# Altium footprint library Connector.PcbLib: 230 footprints (part 14 of 15)
Each footprint in its own frame and in the unit in brackets; x right, y up, seen from the top. Pads: shape width x height; smd on the part's side, far side on the other; paste and mask are expansions set on the pad; w line width, h text height; cw(c..) or ccw(c..) is an arc to the next point about the centre after c.
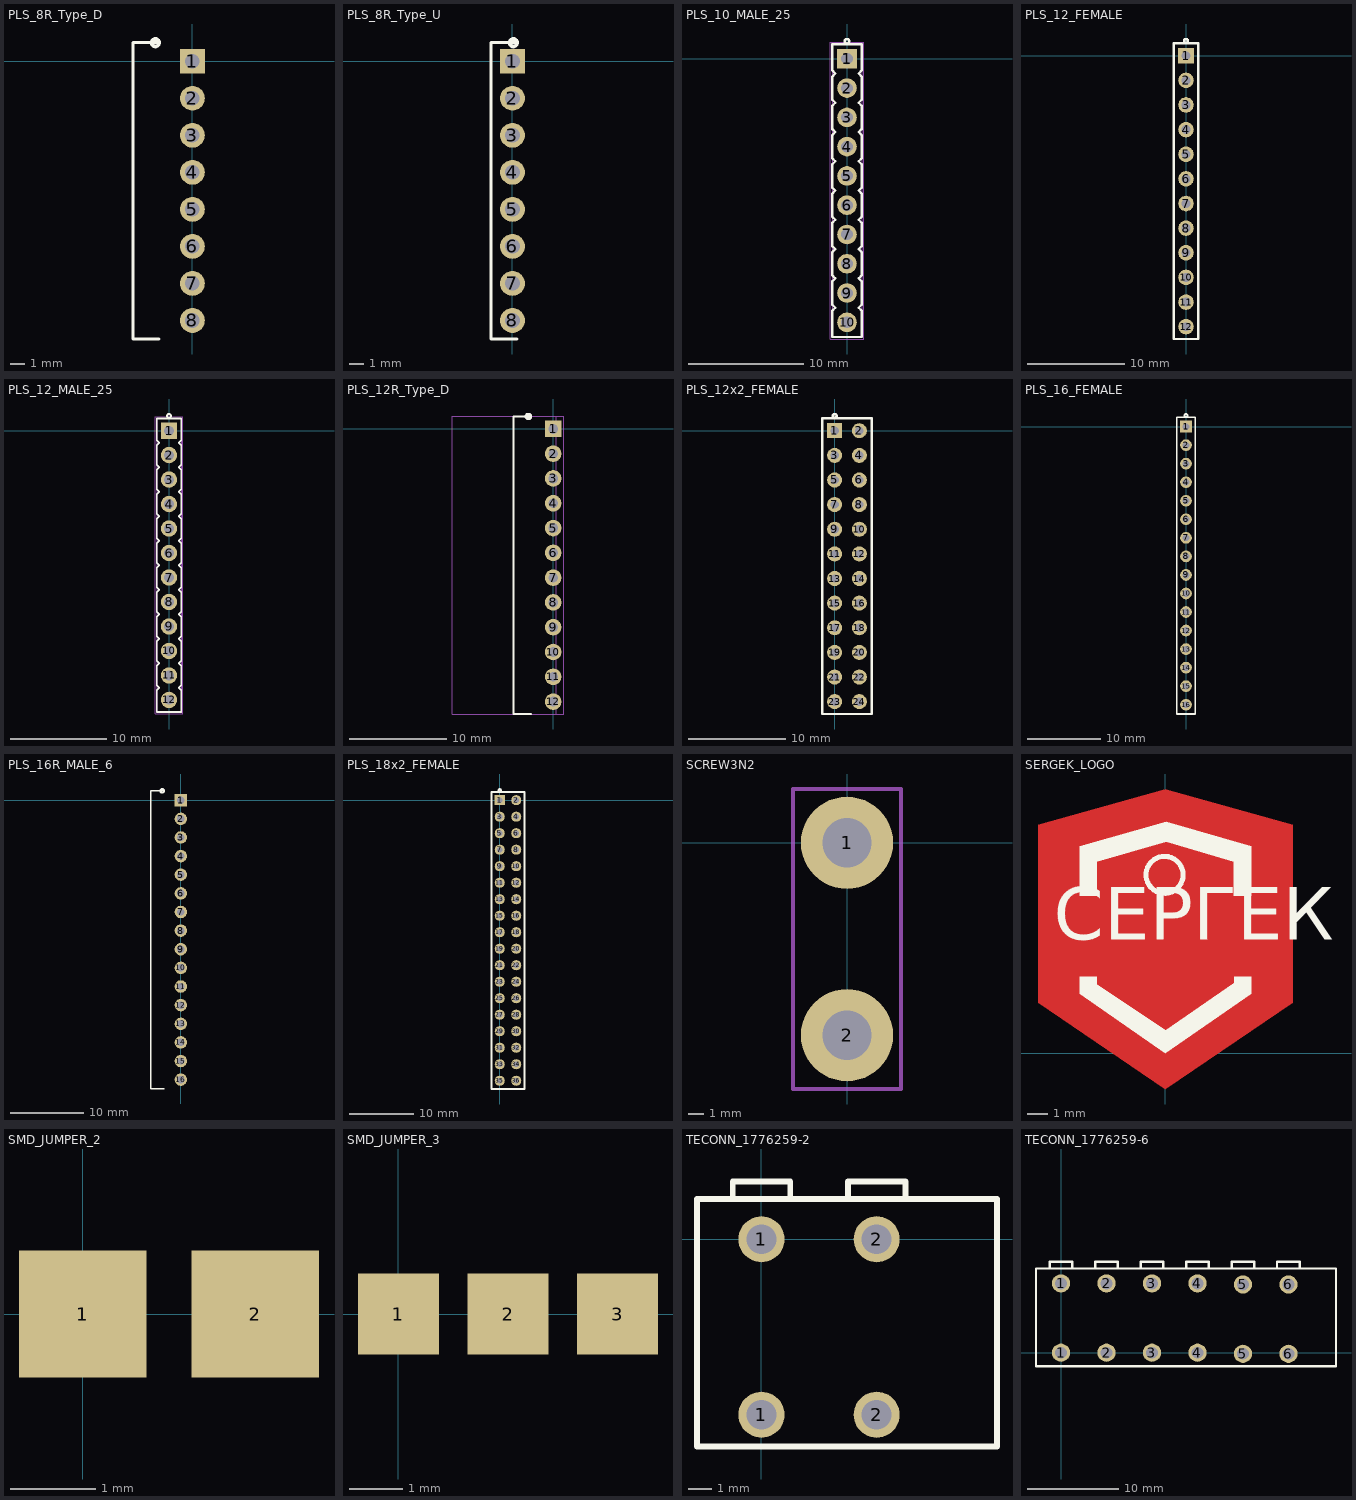
[diagram p13: the footprints below, top view; thin cyan lines are the x and y axes]

## PLS_8R_Type_D [mm] "CONN HEADER R/A 8POS 2.54MM"
height 11.2
pads (8):
  rect 1.7x1.7 hole 1: 1(0,0)
  round 1.7 hole 1: 2(0,-2.54) 3(0,-5.08) 4(0,-7.62) 5(0,-10.16) 6(0,-12.7) 7(0,-15.24) 8(0,-17.78)
Top Overlay:
  circle w0.254: c-2.54,1.27 r0.254
  lines w0.2: -4.064,-19.05 -4.064,-16.51 -4.064,-13.97 -4.064,-11.43 -4.064,-8.89 -4.064,-6.35 -4.064,-3.81 -4.064,-1.27 -4.064,1.27 -2.286,1.27 ; -4.064,-19.041 -2.286,-19.041
3D body: height 11, standoff 0, extent 5.08,0 5.08,0
3D body "User Library-PLS-8R-1.STEP": height 2.52, standoff -3.23, extent -10.34,-19.045 0.32,1.275

## PLS_8R_Type_U [mm] "CONN HEADER R/A 8POS 2.54MM"
height 11.2
pads (8):
  rect 1.7x1.7 hole 1: 1(0,0)
  round 1.7 hole 1: 2(0,-2.54) 3(0,-5.08) 4(0,-7.62) 5(0,-10.16) 6(0,-12.7) 7(0,-15.24) 8(0,-17.78)
Top Overlay:
  circle w0.254: c0.06,1.27 r0.254
  lines w0.2: -1.464,-19.05 -1.464,-16.51 -1.464,-13.97 -1.464,-11.43 -1.464,-8.89 -1.464,-6.35 -1.464,-3.81 -1.464,-1.27 -1.464,1.27 0.314,1.27 ; -1.464,-19.041 0.314,-19.041
3D body: height 11, standoff 0, extent 5.08,0 5.08,0
3D body "User Library-PLS-8R gold.STEP": height 5.45, standoff -3, extent -7.35,-19.05 1.27,1.27

## PLS_10_MALE_25 [mm] "PLH-20 (ZL2029-20),(KLS1-218-1-10-S-3,3*6,5*29)"
height 25
pads (10):
  rect 1.7x1.7 hole 1: 1(0,0)
  round 1.7 hole 1: 2(0,-2.54) 3(0,-5.08) 4(0,-7.62) 5(0,-10.16) 6(0,-12.7) 7(0,-15.24) 8(0,-17.78) 9(0,-20.32) 10(0,-22.86)
Top Overlay:
  circle w0.2: c0,1.524 r0.2
  lines w0.2: -1.27,-24.13 -1.27,-21.844 -1.016,-21.59 -1.27,-21.336 -1.27,-19.304 -1.016,-19.05 -1.27,-18.796 -1.27,-16.764 -1.016,-16.51 -1.27,-16.256 -1.27,-14.224 -1.016,-13.97 -1.27,-13.716 -1.27,-11.684 -1.016,-11.43 -1.27,-11.176 -1.27,-9.144 -1.016,-8.89 -1.27,-8.636 -1.27,-6.604 -1.016,-6.35 -1.27,-6.096 -1.27,-4.064 -1.016,-3.81 -1.27,-3.556 -1.27,-1.524 -1.016,-1.27 -1.27,-1.016 -1.27,1.27 1.27,1.27 1.27,-1.016 1.016,-1.27 1.27,-1.524 1.27,-3.556 1.016,-3.81 1.27,-4.064 1.27,-6.096 1.016,-6.35 1.27,-6.604 1.27,-8.636 1.016,-8.89 1.27,-9.144 1.27,-11.176 1.016,-11.43 1.27,-11.684 1.27,-13.716 1.016,-13.97 1.27,-14.224 1.27,-16.256 1.016,-16.51 1.27,-16.764 1.27,-18.796 1.016,-19.05 1.27,-19.304 1.27,-21.336 1.016,-21.59 1.27,-21.844 1.27,-24.13 -1.27,-24.13
TopAssy:
  lines w0.1: -1.264,-24.125 -1.264,1.273 1.274,1.273 1.274,-24.125 -1.264,-24.125
Border:
  lines w0.1: -0.8,0 0,0 ; 0,-0.8 0,0 ; 0,0.8 0,0 ; 0.8,0 0,0 ; -1.45,-24.31 1.45,-24.31 1.45,1.45 -1.45,1.45 -1.45,-24.31
3D body "PLH-20(KLS1-218-1-10-S-3,3x6,5x29).STEP": height 25.7, standoff -3.3, extent -1.277,-24.123 1.263,1.277

## PLS_12_FEMALE [mm]
pads (12):
  rect 1.61x1.61 hole 0.91: 1(0,0)
  round 1.61 hole 0.91: 2(0,-2.54) 3(0,-5.08) 4(0,-7.62) 5(0,-10.16) 6(0,-12.7) 7(0,-15.24) 8(0,-17.78) 9(0,-20.32) 10(0,-22.86) 11(0,-25.4) 12(0,-27.94)
Top Overlay:
  circle w0.254: c0,1.524 r0.2
  lines w0.254: -1.27,-29.21 1.27,-29.21 1.27,1.27 -1.27,1.27 -1.27,-29.21
3D body: height 8.5, standoff 0, extent -1.27,-29.21 -0.889,1.27
3D body: height 8.5, standoff 0, extent 0.889,-29.21 1.27,1.27
3D body: height 8.5, standoff 0, extent -1.016,1.016 1.016,1.27
3D body: height 8.5, standoff 0, extent -1.016,-1.397 1.016,-1.143
3D body: height 8.5, standoff 0, extent -1.016,-3.937 1.016,-3.683
3D body: height 8.5, standoff 0, extent -1.016,-6.477 1.016,-6.223
3D body: height 8.5, standoff 0, extent -1.016,-9.017 1.016,-8.763
3D body: height 8.5, standoff 0, extent -1.016,-11.557 1.016,-11.303
3D body: height 8.5, standoff 0, extent -1.016,-14.224 1.016,-13.97
3D body: height 8.5, standoff 0, extent -1.016,-16.637 1.016,-16.383
3D body: height 8.5, standoff 0, extent -1.016,-19.177 1.016,-18.923
3D body: height 8.5, standoff 0, extent -1.016,-21.717 1.016,-21.463
3D body: height 8.5, standoff 0, extent -1.016,-24.257 1.016,-24.003
3D body: height 8.5, standoff 0, extent -1.016,-26.797 1.016,-26.543
3D body: height 8.5, standoff 0, extent -1.016,-29.21 1.016,-28.956

## PLS_12_MALE_25 [mm] "PLH-20 (ZL2029-20),(KLS1-218-1-12-S-3,3*6,5*29)"
height 25
pads (12):
  rect 1.7x1.7 hole 1: 1(0,0)
  round 1.7 hole 1: 2(0,-2.54) 3(0,-5.08) 4(0,-7.62) 5(0,-10.16) 6(0,-12.7) 7(0,-15.24) 8(0,-17.78) 9(0,-20.32) 10(0,-22.86) 11(0,-25.4) 12(0,-27.94)
Top Overlay:
  circle w0.2: c0,1.524 r0.2
  lines w0.2: -1.27,-29.21 1.27,-29.21 1.27,-26.924 1.016,-26.67 1.27,-26.416 1.27,-24.384 1.016,-24.13 1.27,-23.876 1.27,-21.844 1.016,-21.59 1.27,-21.336 1.27,-19.304 1.016,-19.05 1.27,-18.796 1.27,-16.764 1.016,-16.51 1.27,-16.256 1.27,-14.224 1.016,-13.97 1.27,-13.716 1.27,-11.684 1.016,-11.43 1.27,-11.176 1.27,-9.144 1.016,-8.89 1.27,-8.636 1.27,-6.604 1.016,-6.35 1.27,-6.096 1.27,-4.064 1.016,-3.81 1.27,-3.556 1.27,-1.524 1.016,-1.27 1.27,-1.016 1.27,1.27 -1.27,1.27 -1.27,-1.016 -1.016,-1.27 -1.27,-1.524 -1.27,-3.556 -1.016,-3.81 -1.27,-4.064 -1.27,-6.096 -1.016,-6.35 -1.27,-6.604 -1.27,-8.636 -1.016,-8.89 -1.27,-9.144 -1.27,-11.176 -1.016,-11.43 -1.27,-11.684 -1.27,-13.716 -1.016,-13.97 -1.27,-14.224 -1.27,-16.256 -1.016,-16.51 -1.27,-16.764 -1.27,-18.796 -1.016,-19.05 -1.27,-19.304 -1.27,-21.336 -1.016,-21.59 -1.27,-21.844 -1.27,-23.876 -1.016,-24.13 -1.27,-24.384 -1.27,-26.416 -1.016,-26.67 -1.27,-26.924 -1.27,-29.21
TopAssy:
  lines w0.1: -1.264,-29.208 1.274,-29.208 1.274,1.273 -1.264,1.273 -1.264,-29.208
Border:
  lines w0.1: -1.45,-29.4 1.45,-29.4 1.45,1.45 -1.45,1.45 -1.45,-29.4
3D body "PLH-20(KLS1-218-1-12-S-3,3x6,5x29).STEP": height 25.7, standoff -3.3, extent -1.27,-29.2 1.27,1.28

## PLS_12R_Type_D [mm] "CONN HEADER R/A 12POS 2.54MM"
height 11.2
pads (12):
  rect 1.7x1.7 hole 1: 1(0,0)
  round 1.7 hole 1: 2(0,-2.54) 3(0,-5.08) 4(0,-7.62) 5(0,-10.16) 6(0,-12.7) 7(0,-15.24) 8(0,-17.78) 9(0,-20.32) 10(0,-22.86) 11(0,-25.4) 12(0,-27.94)
Top Overlay:
  circle w0.254: c-2.54,1.27 r0.254
  lines w0.2: -2.286,-29.201 -4.064,-29.201 -4.064,-16.51 -4.064,-13.97 -4.064,-11.43 -4.064,-8.89 -4.064,-6.35 -4.064,-3.81 -4.064,-1.27 -4.064,1.27 -2.286,1.27
TopAssy:
  lines w0.1: -10.35,-29.21 0.3,-29.21 0.3,1.275 -10.35,1.275 -10.35,-29.21
Border:
  lines w0.1: 1.1,1.275 1.1,-29.21 -4.05,-29.21 -4.05,1.275 1.1,1.275 ; 1.1,1.275 1.1,1.275
3D body: height 11, standoff 0, extent 5.08,0 5.08,0
3D body "User Library-PLS-8R-1.STEP": height 2.52, standoff -3.23, extent -10.34,-29.205 0.32,-8.885
3D body "User Library-PLS-8R-1.STEP": height 2.52, standoff -3.23, extent -10.34,-19.045 0.32,1.275

## PLS_12x2_FEMALE [mm]
pads (24):
  rect 1.55x1.55 hole 0.85: 1(0,0)
  round 1.55 hole 0.85: 2(2.54,0) 3(0,-2.54) 4(2.54,-2.54) 5(0,-5.08) 6(2.54,-5.08) 7(0,-7.62) 8(2.54,-7.62) 9(0,-10.16) 10(2.54,-10.16) 11(0,-12.7) 12(2.54,-12.7) 13(0,-15.24) 14(2.54,-15.24) 15(0,-17.78) 16(2.54,-17.78) 17(0,-20.32) 18(2.54,-20.32) 19(0,-22.86) 20(2.54,-22.86) 21(0,-25.4) 22(2.54,-25.4) 23(0,-27.94) 24(2.54,-27.94)
Top Overlay:
  circle w0.254: c0,1.524 r0.2
  lines w0.254: -1.27,-29.21 -1.27,1.27 3.81,1.27 3.81,-29.21 -1.27,-29.21
3D body: height 8.5, standoff 0, extent 1.524,-29.21 3.556,-28.956
3D body: height 8.5, standoff 0, extent 1.524,-26.67 3.556,-26.416
3D body: height 8.5, standoff 0, extent 1.524,-24.13 3.556,-23.876
3D body: height 8.5, standoff 0, extent 1.524,-21.59 3.556,-21.336
3D body: height 8.5, standoff 0, extent 1.524,-19.05 3.556,-18.796
3D body: height 8.5, standoff 0, extent 1.524,-16.51 3.556,-16.256
3D body: height 8.5, standoff 0, extent 1.524,-14.097 3.556,-13.843
3D body: height 8.5, standoff 0, extent 1.524,-11.43 3.556,-11.176
3D body: height 8.5, standoff 0, extent 1.524,-8.89 3.556,-8.636
3D body: height 8.5, standoff 0, extent 1.524,-6.35 3.556,-6.096
3D body: height 8.5, standoff 0, extent 1.524,-3.81 3.556,-3.556
3D body: height 8.5, standoff 0, extent 1.524,-1.27 3.556,-1.016
3D body: height 8.5, standoff 0, extent 1.524,1.016 3.556,1.27
3D body: height 8.5, standoff 0, extent 3.429,-29.21 3.81,1.27
3D body: height 8.5, standoff 0, extent 1.27,-29.21 1.651,1.27
3D body: height 8.5, standoff 0, extent -1.016,-29.21 1.016,-28.956
3D body: height 8.5, standoff 0, extent -1.016,-26.67 1.016,-26.416
3D body: height 8.5, standoff 0, extent -1.016,-24.13 1.016,-23.876
3D body: height 8.5, standoff 0, extent -1.016,-21.59 1.016,-21.336
3D body: height 8.5, standoff 0, extent -1.016,-19.05 1.016,-18.796
3D body: height 8.5, standoff 0, extent -1.016,-16.51 1.016,-16.256
3D body: height 8.5, standoff 0, extent -1.016,-14.097 1.016,-13.843
3D body: height 8.5, standoff 0, extent -1.016,-11.43 1.016,-11.176
3D body: height 8.5, standoff 0, extent -1.016,-8.89 1.016,-8.636
3D body: height 8.5, standoff 0, extent -1.016,-6.35 1.016,-6.096
3D body: height 8.5, standoff 0, extent -1.016,-3.81 1.016,-3.556
3D body: height 8.5, standoff 0, extent -1.016,-1.27 1.016,-1.016
3D body: height 8.5, standoff 0, extent -1.016,1.016 1.016,1.27
3D body: height 8.5, standoff 0, extent 0.889,-29.21 1.27,1.27
3D body: height 8.5, standoff 0, extent -1.27,-29.21 -0.889,1.27

## PLS_16_FEMALE [mm]
pads (16):
  rect 1.61x1.61 hole 0.91: 1(0,0)
  round 1.61 hole 0.91: 2(0,-2.54) 3(0,-5.08) 4(0,-7.62) 5(0,-10.16) 6(0,-12.7) 7(0,-15.24) 8(0,-17.78) 9(0,-20.32) 10(0,-22.86) 11(0,-25.4) 12(0,-27.94) 13(0,-30.48) 14(0,-33.02) 15(0,-35.56) 16(0,-38.1)
Top Overlay:
  circle w0.254: c0,1.524 r0.2
  lines w0.254: -1.27,-39.37 1.27,-39.37 1.27,1.27 -1.27,1.27 -1.27,-39.37
3D body: height 8.5, standoff 0, extent -1.27,-29.21 -0.889,1.27
3D body: height 8.5, standoff 0, extent 0.889,-29.21 1.27,1.27
3D body: height 8.5, standoff 0, extent -1.016,0.889 1.016,1.27
3D body: height 8.5, standoff 0, extent -1.016,-1.397 1.016,-1.143
3D body: height 8.5, standoff 0, extent -1.016,-3.937 1.016,-3.683
3D body: height 8.5, standoff 0, extent -1.016,-6.477 1.016,-6.223
3D body: height 8.5, standoff 0, extent -1.016,-9.017 1.016,-8.763
3D body: height 8.5, standoff 0, extent -1.016,-11.557 1.016,-11.303
3D body: height 8.5, standoff 0, extent -1.016,-14.224 1.016,-13.97
3D body: height 8.5, standoff 0, extent -1.016,-16.637 1.016,-16.383
3D body: height 8.5, standoff 0, extent -1.016,-19.177 1.016,-18.923
3D body: height 8.5, standoff 0, extent -1.016,-21.717 1.016,-21.463
3D body: height 8.5, standoff 0, extent -1.016,-24.257 1.016,-24.003
3D body: height 8.5, standoff 0, extent -1.016,-26.797 1.016,-26.543
3D body: height 8.5, standoff 0, extent -1.27,-39.37 -0.889,-28.829
3D body: height 8.5, standoff 0, extent 0.889,-39.37 1.27,-28.829
3D body: height 8.5, standoff 0, extent -1.016,-29.337 1.016,-29.083
3D body: height 8.5, standoff 0, extent -1.016,-31.496 1.016,-31.242
3D body: height 8.5, standoff 0, extent -1.016,-34.036 1.016,-33.782
3D body: height 8.5, standoff 0, extent -1.016,-36.576 1.016,-36.322
3D body: height 8.5, standoff 0, extent -1.016,-39.37 1.016,-39.116

## PLS_16R_MALE_6 [mm] "CONN HEADER R/A 16POS 2.54MM"
height 11.2
pads (16):
  rect 1.7x1.7 hole 1: 1(0,0)
  round 1.7 hole 1: 2(0,-2.54) 3(0,-5.08) 4(0,-7.62) 5(0,-10.16) 6(0,-12.7) 7(0,-15.24) 8(0,-17.78) 9(0,-20.32) 10(0,-22.86) 11(0,-25.4) 12(0,-27.94) 13(0,-30.48) 14(0,-33.02) 15(0,-35.56) 16(0,-38.1)
Top Overlay:
  circle w0.254: c-2.54,1.27 r0.254
  lines w0.2: -2.286,-39.37 -4.064,-39.37 -4.064,-36.83 -4.064,-34.29 -4.064,-31.75 -4.064,-29.21 -4.064,-26.67 -4.064,-24.13 -4.064,-21.59 -4.064,-19.05 -4.064,-16.51 -4.064,-13.97 -4.064,-11.43 -4.064,-8.89 -4.064,-6.35 -4.064,-3.81 -4.064,-1.27 -4.064,1.27 -2.286,1.27
3D body: height 1.59, standoff 0, extent -0.33,-0.33 0.33,0.33
3D body: height 1.59, standoff 0, extent -0.33,-10.49 0.33,-9.83
3D body: height 1.59, standoff 0, extent -0.33,-20.65 0.33,-19.99
3D body: height 1.59, standoff 0, extent -0.33,-30.81 0.33,-30.15
3D body: height 1.59, standoff 0, extent -0.33,-2.87 0.33,-2.21
3D body: height 1.59, standoff 0, extent -0.33,-5.41 0.33,-4.75
3D body: height 1.59, standoff 0, extent -0.33,-7.95 0.33,-7.29
3D body: height 1.59, standoff 0, extent -0.33,-13.03 0.33,-12.37
3D body: height 1.59, standoff 0, extent -0.33,-15.57 0.33,-14.91
3D body: height 1.59, standoff 0, extent -0.33,-18.11 0.33,-17.45
3D body: height 1.59, standoff 0, extent -0.33,-23.19 0.33,-22.53
3D body: height 1.59, standoff 0, extent -0.33,-25.73 0.33,-25.07
3D body: height 1.59, standoff 0, extent -0.33,-28.27 0.33,-27.61
3D body: height 1.59, standoff 0, extent -0.33,-33.35 0.33,-32.69
3D body: height 1.59, standoff 0, extent -0.33,-35.89 0.33,-35.23
3D body: height 1.59, standoff 0, extent -0.33,-38.43 0.33,-37.77
3D body: height 1.59, standoff 0.95, extent -10.16,-0.33 0,0.33
3D body: height 1.59, standoff 0.95, extent -10.16,-10.49 0,-9.83
3D body: height 1.59, standoff 0.95, extent -10.16,-20.65 0,-19.99
3D body: height 1.59, standoff 0.95, extent -10.16,-30.81 0,-30.15
3D body: height 1.59, standoff 0.95, extent -10.16,-2.87 0,-2.21
3D body: height 1.59, standoff 0.95, extent -10.16,-5.41 0,-4.75
3D body: height 1.59, standoff 0.95, extent -10.16,-7.95 0,-7.29
3D body: height 1.59, standoff 0.95, extent -10.16,-13.03 0,-12.37
3D body: height 1.59, standoff 0.95, extent -10.16,-15.57 0,-14.91
3D body: height 1.59, standoff 0.95, extent -10.16,-18.11 0,-17.45
3D body: height 1.59, standoff 0.95, extent -10.16,-23.19 0,-22.53
3D body: height 1.59, standoff 0.95, extent -10.16,-25.73 0,-25.07
3D body: height 1.59, standoff 0.95, extent -10.16,-28.27 0,-27.61
3D body: height 1.59, standoff 0.95, extent -10.16,-33.35 0,-32.69
3D body: height 1.59, standoff 0.95, extent -10.16,-35.89 0,-35.23
3D body: height 1.59, standoff 0.95, extent -10.16,-38.43 0,-37.77
3D body: height 2.54, standoff 0, extent -4.064,-39.37 -1.5,-36.83
3D body: height 2.54, standoff 0, extent -4.064,-36.83 -1.5,-34.29
3D body: height 2.54, standoff 0, extent -4.064,-34.29 -1.5,-31.75
3D body: height 2.54, standoff 0, extent -4.064,-31.75 -1.5,-29.21
3D body: height 2.54, standoff 0, extent -4.064,-29.21 -1.5,-26.67
3D body: height 2.54, standoff 0, extent -4.064,-26.67 -1.5,-24.13
3D body: height 2.54, standoff 0, extent -4.064,-24.13 -1.5,-21.59
3D body: height 2.54, standoff 0, extent -4.064,-21.59 -1.5,-19.05
3D body: height 2.54, standoff 0, extent -4.064,-19.05 -1.5,-16.51
3D body: height 2.54, standoff 0, extent -4.064,-16.51 -1.5,-13.97
3D body: height 2.54, standoff 0, extent -4.064,-13.97 -1.5,-11.43
3D body: height 2.54, standoff 0, extent -4.064,-11.43 -1.5,-8.89
3D body: height 2.54, standoff 0, extent -4.064,-8.89 -1.5,-6.35
3D body: height 2.54, standoff 0, extent -4.064,-6.35 -1.5,-3.81
3D body: height 2.54, standoff 0, extent -4.064,-3.81 -1.5,-1.27
3D body: height 2.54, standoff 0, extent -4.064,-1.27 -1.5,1.27
3D body: height 11, standoff 0, extent 5.08,0 5.08,0

## PLS_18x2_FEMALE [mm]
pads (36):
  rect 1.55x1.55 hole 0.85: 1(0,0)
  round 1.55 hole 0.85: 2(2.54,0) 3(0,-2.54) 4(2.54,-2.54) 5(0,-5.08) 6(2.54,-5.08) 7(0,-7.62) 8(2.54,-7.62) 9(0,-10.16) 10(2.54,-10.16) 11(0,-12.7) 12(2.54,-12.7) 13(0,-15.24) 14(2.54,-15.24) 15(0,-17.78) 16(2.54,-17.78) 17(0,-20.32) 18(2.54,-20.32) 19(0,-22.86) 20(2.54,-22.86) 21(0,-25.4) 22(2.54,-25.4) 23(0,-27.94) 24(2.54,-27.94) 25(0,-30.48) 26(2.54,-30.48) 27(0,-33.02) 28(2.54,-33.02) 29(0,-35.56) 30(2.54,-35.56) 31(0,-38.1) 32(2.54,-38.1) 33(0,-40.64) 34(2.54,-40.64) 35(0,-43.18) 36(2.54,-43.18)
Top Overlay:
  circle w0.254: c0,1.524 r0.2
  lines w0.254: -1.27,-44.45 -1.27,1.27 3.81,1.27 3.81,-44.45 -1.27,-44.45
3D body: height 8.5, standoff 0, extent 1.524,-11.557 3.556,-11.303
3D body: height 8.5, standoff 0, extent 1.524,-9.017 3.556,-8.763
3D body: height 8.5, standoff 0, extent 1.524,-6.477 3.556,-6.223
3D body: height 8.5, standoff 0, extent 1.524,-3.937 3.556,-3.683
3D body: height 8.5, standoff 0, extent 1.524,-1.397 3.556,-1.143
3D body: height 8.5, standoff 0, extent -1.27,-29.21 -0.889,1.27
3D body: height 8.5, standoff 0, extent 0.889,-29.21 1.27,1.27
3D body: height 8.5, standoff 0, extent -1.016,1.016 1.016,1.27
3D body: height 8.5, standoff 0, extent -1.016,-1.397 1.016,-1.143
3D body: height 8.5, standoff 0, extent -1.016,-3.937 1.016,-3.683
3D body: height 8.5, standoff 0, extent -1.016,-6.477 1.016,-6.223
3D body: height 8.5, standoff 0, extent -1.016,-9.017 1.016,-8.763
3D body: height 8.5, standoff 0, extent -1.016,-11.557 1.016,-11.303
3D body: height 8.5, standoff 0, extent -1.016,-14.097 1.016,-13.843
3D body: height 8.5, standoff 0, extent -1.016,-16.637 1.016,-16.383
3D body: height 8.5, standoff 0, extent -1.016,-19.177 1.016,-18.923
3D body: height 8.5, standoff 0, extent -1.016,-21.717 1.016,-21.463
3D body: height 8.5, standoff 0, extent -1.016,-24.257 1.016,-24.003
3D body: height 8.5, standoff 0, extent -1.016,-26.797 1.016,-26.543
3D body: height 8.5, standoff 0, extent -1.27,-44.45 -0.889,-28.956
3D body: height 8.5, standoff 0, extent 0.889,-44.45 1.27,-28.956
3D body: height 8.5, standoff 0, extent -1.016,-29.337 1.016,-29.083
3D body: height 8.5, standoff 0, extent -1.016,-31.877 1.016,-31.623
3D body: height 8.5, standoff 0, extent -1.016,-34.417 1.016,-34.163
3D body: height 8.5, standoff 0, extent -1.016,-36.957 1.016,-36.703
3D body: height 8.5, standoff 0, extent -1.016,-39.497 1.016,-39.243
3D body: height 8.5, standoff 0, extent -1.016,-42.037 1.016,-41.783
3D body: height 8.5, standoff 0, extent -1.016,-44.45 1.016,-44.196
3D body: height 8.5, standoff 0, extent 3.429,-44.45 3.81,1.27
3D body: height 8.5, standoff 0, extent 1.27,-44.45 1.651,1.27
3D body: height 8.5, standoff 0, extent 1.524,-29.337 3.556,-29.083
3D body: height 8.5, standoff 0, extent 1.524,-31.877 3.556,-31.623
3D body: height 8.5, standoff 0, extent 1.524,-34.417 3.556,-34.163
3D body: height 8.5, standoff 0, extent 1.524,-36.957 3.556,-36.703
3D body: height 8.5, standoff 0, extent 1.524,-39.497 3.556,-39.243
3D body: height 8.5, standoff 0, extent 1.524,-42.037 3.556,-41.783
3D body: height 8.5, standoff 0, extent 1.524,-44.45 3.556,-44.196
3D body: height 8.5, standoff 0, extent 1.524,-26.797 3.556,-26.543
3D body: height 8.5, standoff 0, extent 1.567,-24.275 3.599,-24.021
3D body: height 8.5, standoff 0, extent 1.567,-21.739 3.599,-21.485
3D body: height 8.5, standoff 0, extent 1.524,-19.177 3.556,-18.923
3D body: height 8.5, standoff 0, extent 1.524,-16.637 3.556,-16.383
3D body: height 8.5, standoff 0, extent 1.524,-14.097 3.556,-13.843

## SCREW3N2 [mm]
pads (2):
  round 6 hole 3.2: 1(0,0) 2(0,-12.5)
Top Overlay:
  circle w0.254: c0,-12.5 r2.5
  circle w0.254: c0,0 r2.5
TopAssy:
  circle w0.254: c0,0 r2.5
  circle w0.254: c0,-12.5 r2.5
Border:
  lines w0.254: -3.5,-16 3.5,-16 3.5,3.5 -3.5,3.5 -3.5,-16
3D body: height 1.5, standoff 0, extent -2.5,-2.497 2.5,2.497
3D body: height 1.5, standoff 0, extent -2.5,-14.997 2.5,-10.003

## SERGEK_LOGO [mm]
Top Layer:
  circle w0.254: c-0.045,8.92 r0.925
  region: 4.28,2.979 0,0 -4.295,2.971 -4.295,3.82 -3.445,3.82 -3.445,3.445 0.005,1.145 3.405,3.495 3.43,3.52 3.43,3.82 4.28,3.82
  region: 4.28,10.345 4.28,7.87 3.405,7.87 3.405,9.57 0.03,10.57 -3.445,9.57 -3.445,7.87 -4.295,7.87 -4.295,10.345 0.03,11.57
  pour cut-out: -6.35,2.54 0,-1.778 6.35,2.54 6.35,11.43 0,13.208 -6.35,11.43
  text "СЕРГЕК" at -5.57,4.795 h4.5
Top Overlay:
  circle w0.254: c-0.045,8.92 r0.925
  region: 4.28,10.345 4.28,7.87 3.405,7.87 3.405,9.57 0.03,10.57 -3.445,9.57 -3.445,7.87 -4.295,7.87 -4.295,10.345 0.03,11.57
  region: 4.28,2.979 0,0 -4.295,2.971 -4.295,3.82 -3.445,3.82 -3.445,3.445 0.005,1.145 3.405,3.495 3.43,3.52 3.43,3.82 4.28,3.82
  text "СЕРГЕК" at -5.57,4.795 h4.5

## SMD_JUMPER_2 [mm]
pads (2):
  rect 1.5x1.5 smd: 1(0,0) 2(2.032,0)

## SMD_JUMPER_3 [mm]
pads (3):
  rect 1.5x1.5 smd: 1(0,0) 2(2.032,0) 3(4.064,0)

## TECONN_1776259-2 [mm] "TERM BLK 2POS TOP ENTRY 5MM PCB"
pads (4):
  round 2 hole 1.3: 1(0,-7.62) 1(0,0) 2(5,-7.62) 2(5,0)
Top Overlay:
  lines w0.254: -1.25,1.757 -1.25,2.507 1.25,2.507 1.25,1.757 ; 3.75,1.757 3.75,2.507 6.25,2.507 6.25,1.757 ; -2.8,-9 10.226,-9 10.226,1.75 -2.8,1.75 -2.8,-9
3D body: height 14, standoff 0, extent -2.5,-8.75 10,1.5
3D body: height 14, standoff 7, extent -1.25,1.007 1.25,2.507
3D body: height 14, standoff 7, extent 3.75,1.007 6.25,2.507

## TECONN_1776259-6 [mm] "TERM BLK 6POS TOP ENTRY 5MM PCB"
pads (12):
  round 2 hole 1.3: 1(0,0) 1(0,7.62) 2(5,0) 2(5,7.62) 3(10,0) 3(10,7.62) 4(15,0) 4(15,7.62) 5(20,-0.12) 5(20,7.5) 6(25,-0.12) 6(25,7.5)
Top Overlay:
  lines w0.254: -1.25,9.25 -1.25,10 1.25,10 1.25,9.25 ; 3.75,9.25 3.75,10 6.25,10 6.25,9.25 ; 8.75,9.25 8.75,10 11.25,10 11.25,9.25 ; 13.75,9.25 13.75,10 16.25,10 16.25,9.25 ; 18.75,9.257 18.75,10.007 21.25,10.007 21.25,9.257 ; 23.75,9.257 23.75,10.007 26.25,10.007 26.25,9.257 ; -2.75,-1.5 -2.75,9.25 30.226,9.25 30.226,-1.5 -2.75,-1.5
3D body: height 14, standoff 7, extent 23.75,8.507 26.25,10.007
3D body: height 14, standoff 7, extent 18.75,8.507 21.25,10.007
3D body: height 14, standoff 0, extent -2.5,-1.25 30,9
3D body: height 14, standoff 7, extent -1.25,8.5 1.25,10
3D body: height 14, standoff 7, extent 3.75,8.5 6.25,10
3D body: height 14, standoff 7, extent 8.75,8.5 11.25,10
3D body: height 14, standoff 7, extent 13.75,8.5 16.25,10